# Altium footprint library ST封装.PcbLib: 1336 footprints (part 84 of 109)
Each footprint in its own frame and in the unit in brackets; x right, y up, seen from the top. Pads: shape width x height; smd on the part's side, far side on the other; paste and mask are expansions set on the pad; w line width, h text height; cw(c..) or ccw(c..) is an arc to the next point about the centre after c.
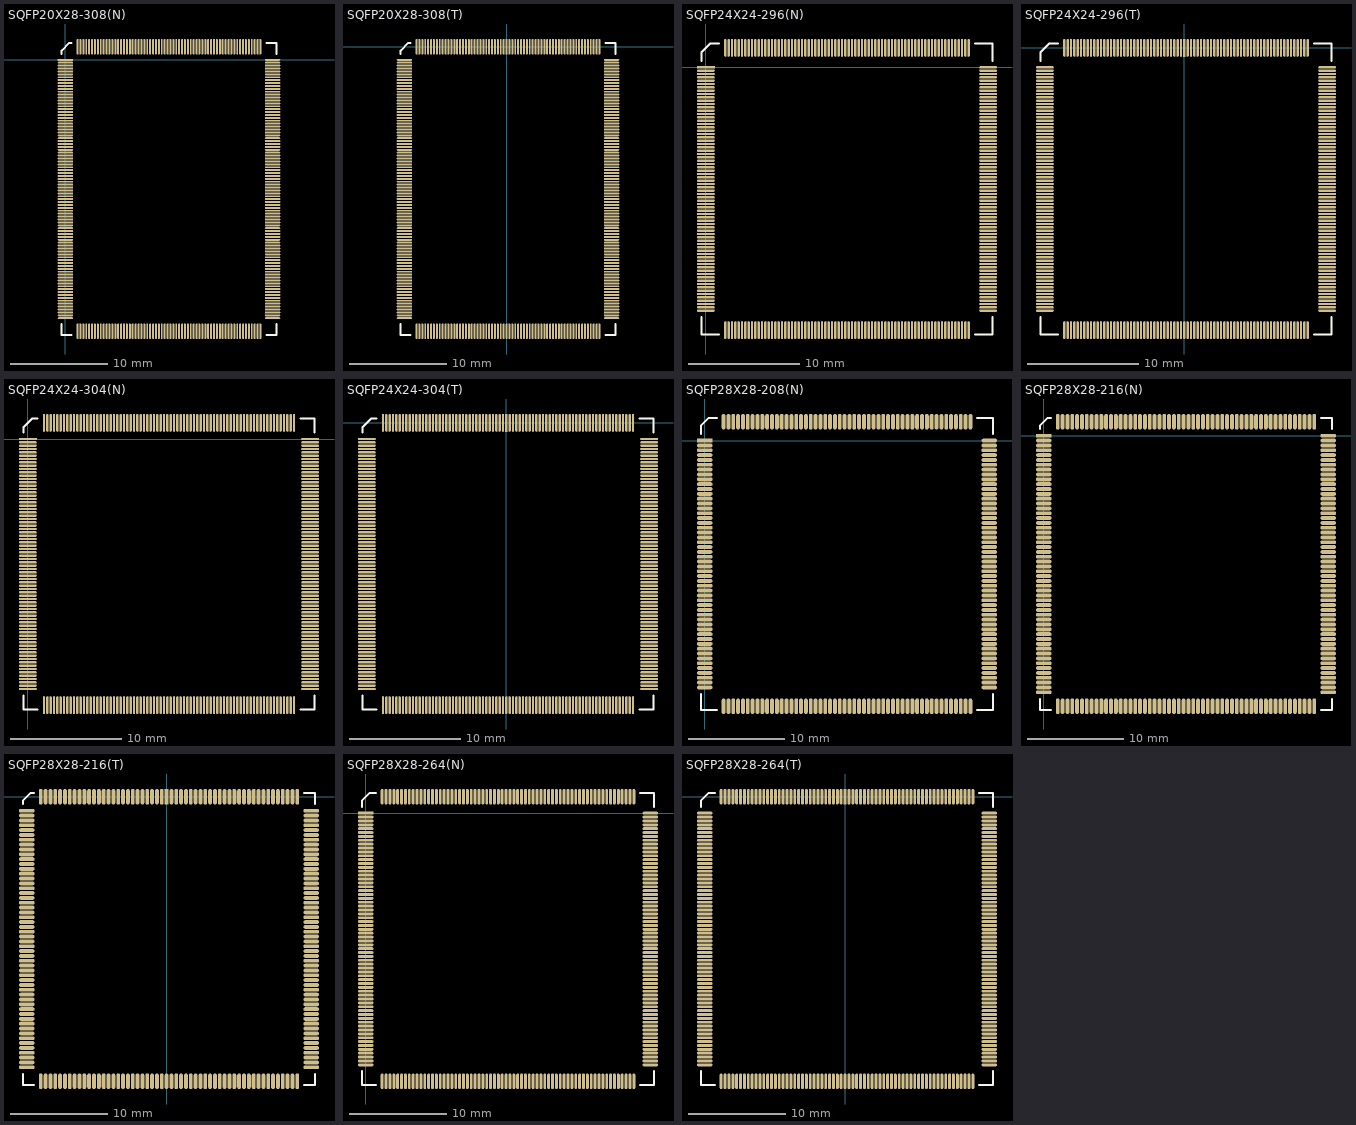
[diagram p83: the footprints below, top view; thin cyan lines are the x and y axes]

## SQFP20X28-308(N) [mm]
pads (308):
  rect 1.6x0.2 smd: 1(0,0)
  oval 1.6x0.2 smd: 2(0,-0.3) 3(0,-0.6) 4(0,-0.9) 5(0,-1.2) 6(0,-1.5) 7(0,-1.8) 8(0,-2.1) 9(0,-2.4) 10(0,-2.7) 11(0,-3) 12(0,-3.3) 13(0,-3.6) 14(0,-3.9) 15(0,-4.2) 16(0,-4.5) 17(0,-4.8) 18(0,-5.1) 19(0,-5.4) 20(0,-5.7) 21(0,-6) 22(0,-6.3) 23(0,-6.6) 24(0,-6.9) 25(0,-7.2) 26(0,-7.5) 27(0,-7.8) 28(0,-8.1) 29(0,-8.4) 30(0,-8.7) 31(0,-9) 32(0,-9.3) 33(0,-9.6) 34(0,-9.9) 35(0,-10.2) 36(0,-10.5) 37(0,-10.8) 38(0,-11.1) 39(0,-11.4) 40(0,-11.7) 41(0,-12) 42(0,-12.3) 43(0,-12.6) 44(0,-12.9) 45(0,-13.2) 46(0,-13.5) 47(0,-13.8) 48(0,-14.1) 49(0,-14.4) 50(0,-14.7) 51(0,-15) 52(0,-15.3) 53(0,-15.6) 54(0,-15.9) 55(0,-16.2) 56(0,-16.5) 57(0,-16.8) 58(0,-17.1) 59(0,-17.4) 60(0,-17.7) 61(0,-18) 62(0,-18.3) 63(0,-18.6) 64(0,-18.9) 65(0,-19.2) 66(0,-19.5) 67(0,-19.8) 68(0,-20.1) 69(0,-20.4) 70(0,-20.7) 71(0,-21) 72(0,-21.3) 73(0,-21.6) 74(0,-21.9) 75(0,-22.2) 76(0,-22.5) 77(0,-22.8) 78(0,-23.1) 79(0,-23.4) 80(0,-23.7) 81(0,-24) 82(0,-24.3) 83(0,-24.6) 84(0,-24.9) 85(0,-25.2) 86(0,-25.5) 87(0,-25.8) 88(0,-26.1) 89(0,-26.4) 90(0,-26.7) 155(21.4,-26.7) 156(21.4,-26.4) 157(21.4,-26.1) 158(21.4,-25.8) 159(21.4,-25.5) 160(21.4,-25.2) 161(21.4,-24.9) 162(21.4,-24.6) 163(21.4,-24.3) 164(21.4,-24) 165(21.4,-23.7) 166(21.4,-23.4) 167(21.4,-23.1) 168(21.4,-22.8) 169(21.4,-22.5) 170(21.4,-22.2) 171(21.4,-21.9) 172(21.4,-21.6) 173(21.4,-21.3) 174(21.4,-21) 175(21.4,-20.7) 176(21.4,-20.4) 177(21.4,-20.1) 178(21.4,-19.8) 179(21.4,-19.5) 180(21.4,-19.2) 181(21.4,-18.9) 182(21.4,-18.6) 183(21.4,-18.3) 184(21.4,-18) 185(21.4,-17.7) 186(21.4,-17.4) 187(21.4,-17.1) 188(21.4,-16.8) 189(21.4,-16.5) 190(21.4,-16.2) 191(21.4,-15.9) 192(21.4,-15.6) 193(21.4,-15.3) 194(21.4,-15) 195(21.4,-14.7) 196(21.4,-14.4) 197(21.4,-14.1) 198(21.4,-13.8) 199(21.4,-13.5) 200(21.4,-13.2) 201(21.4,-12.9) 202(21.4,-12.6) 203(21.4,-12.3) 204(21.4,-12) 205(21.4,-11.7) 206(21.4,-11.4) 207(21.4,-11.1) 208(21.4,-10.8) 209(21.4,-10.5) 210(21.4,-10.2) 211(21.4,-9.9) 212(21.4,-9.6) 213(21.4,-9.3) 214(21.4,-9) 215(21.4,-8.7) 216(21.4,-8.4) 217(21.4,-8.1) 218(21.4,-7.8) 219(21.4,-7.5) 220(21.4,-7.2) 221(21.4,-6.9) 222(21.4,-6.6) 223(21.4,-6.3) 224(21.4,-6) 225(21.4,-5.7) 226(21.4,-5.4) 227(21.4,-5.1) 228(21.4,-4.8) 229(21.4,-4.5) 230(21.4,-4.2) 231(21.4,-3.9) 232(21.4,-3.6) 233(21.4,-3.3) 234(21.4,-3) 235(21.4,-2.7) 236(21.4,-2.4) 237(21.4,-2.1) 238(21.4,-1.8) 239(21.4,-1.5) 240(21.4,-1.2) 241(21.4,-0.9) 242(21.4,-0.6) 243(21.4,-0.3) 244(21.4,0)
  oval 0.2x1.6 smd: 91(1.25,-28.05) 92(1.55,-28.05) 93(1.85,-28.05) 94(2.15,-28.05) 95(2.45,-28.05) 96(2.75,-28.05) 97(3.05,-28.05) 98(3.35,-28.05) 99(3.65,-28.05) 100(3.95,-28.05) 101(4.25,-28.05) 102(4.55,-28.05) 103(4.85,-28.05) 104(5.15,-28.05) 105(5.45,-28.05) 106(5.75,-28.05) 107(6.05,-28.05) 108(6.35,-28.05) 109(6.65,-28.05) 110(6.95,-28.05) 111(7.25,-28.05) 112(7.55,-28.05) 113(7.85,-28.05) 114(8.15,-28.05) 115(8.45,-28.05) 116(8.75,-28.05) 117(9.05,-28.05) 118(9.35,-28.05) 119(9.65,-28.05) 120(9.95,-28.05) 121(10.25,-28.05) 122(10.55,-28.05) 123(10.85,-28.05) 124(11.15,-28.05) 125(11.45,-28.05) 126(11.75,-28.05) 127(12.05,-28.05) 128(12.35,-28.05) 129(12.65,-28.05) 130(12.95,-28.05) 131(13.25,-28.05) 132(13.55,-28.05) 133(13.85,-28.05) 134(14.15,-28.05) 135(14.45,-28.05) 136(14.75,-28.05) 137(15.05,-28.05) 138(15.35,-28.05) 139(15.65,-28.05) 140(15.95,-28.05) 141(16.25,-28.05) 142(16.55,-28.05) 143(16.85,-28.05) 144(17.15,-28.05) 145(17.45,-28.05) 146(17.75,-28.05) 147(18.05,-28.05) 148(18.35,-28.05) 149(18.65,-28.05) 150(18.95,-28.05) 151(19.25,-28.05) 152(19.55,-28.05) 153(19.85,-28.05) 154(20.15,-28.05) 245(20.15,1.35) 246(19.85,1.35) 247(19.55,1.35) 248(19.25,1.35) 249(18.95,1.35) 250(18.65,1.35) 251(18.35,1.35) 252(18.05,1.35) 253(17.75,1.35) 254(17.45,1.35) 255(17.15,1.35) 256(16.85,1.35) 257(16.55,1.35) 258(16.25,1.35) 259(15.95,1.35) 260(15.65,1.35) 261(15.35,1.35) 262(15.05,1.35) 263(14.75,1.35) 264(14.45,1.35) 265(14.15,1.35) 266(13.85,1.35) 267(13.55,1.35) 268(13.25,1.35) 269(12.95,1.35) 270(12.65,1.35) 271(12.35,1.35) 272(12.05,1.35) 273(11.75,1.35) 274(11.45,1.35) 275(11.15,1.35) 276(10.85,1.35) 277(10.55,1.35) 278(10.25,1.35) 279(9.95,1.35) 280(9.65,1.35) 281(9.35,1.35) 282(9.05,1.35) 283(8.75,1.35) 284(8.45,1.35) 285(8.15,1.35) 286(7.85,1.35) 287(7.55,1.35) 288(7.25,1.35) 289(6.95,1.35) 290(6.65,1.35) 291(6.35,1.35) 292(6.05,1.35) 293(5.75,1.35) 294(5.45,1.35) 295(5.15,1.35) 296(4.85,1.35) 297(4.55,1.35) 298(4.25,1.35) 299(3.95,1.35) 300(3.65,1.35) 301(3.35,1.35) 302(3.05,1.35) 303(2.75,1.35) 304(2.45,1.35) 305(2.15,1.35) 306(1.85,1.35) 307(1.55,1.35) 308(1.25,1.35)
Top Overlay:
  lines w0.2: -0.4,-27.3 -0.4,-28.45 0.65,-28.45 ; -0.4,0.6 -0.4,0.95 0.4,1.75 0.65,1.75 ; 20.75,-28.45 21.8,-28.45 21.8,-27.3 ; 20.75,1.75 21.8,1.75 21.8,0.6

## SQFP20X28-308(T) [mm]
pads (308):
  rect 0.2x1.6 smd: 1(0,0)
  oval 0.2x1.6 smd: 2(-0.3,0) 3(-0.6,0) 4(-0.9,0) 5(-1.2,0) 6(-1.5,0) 7(-1.8,0) 8(-2.1,0) 9(-2.4,0) 10(-2.7,0) 11(-3,0) 12(-3.3,0) 13(-3.6,0) 14(-3.9,0) 15(-4.2,0) 16(-4.5,0) 17(-4.8,0) 18(-5.1,0) 19(-5.4,0) 20(-5.7,0) 21(-6,0) 22(-6.3,0) 23(-6.6,0) 24(-6.9,0) 25(-7.2,0) 26(-7.5,0) 27(-7.8,0) 28(-8.1,0) 29(-8.4,0) 30(-8.7,0) 31(-9,0) 32(-9.3,0) 123(-9.3,-29.4) 124(-9,-29.4) 125(-8.7,-29.4) 126(-8.4,-29.4) 127(-8.1,-29.4) 128(-7.8,-29.4) 129(-7.5,-29.4) 130(-7.2,-29.4) 131(-6.9,-29.4) 132(-6.6,-29.4) 133(-6.3,-29.4) 134(-6,-29.4) 135(-5.7,-29.4) 136(-5.4,-29.4) 137(-5.1,-29.4) 138(-4.8,-29.4) 139(-4.5,-29.4) 140(-4.2,-29.4) 141(-3.9,-29.4) 142(-3.6,-29.4) 143(-3.3,-29.4) 144(-3,-29.4) 145(-2.7,-29.4) 146(-2.4,-29.4) 147(-2.1,-29.4) 148(-1.8,-29.4) 149(-1.5,-29.4) 150(-1.2,-29.4) 151(-0.9,-29.4) 152(-0.6,-29.4) 153(-0.3,-29.4) 154(0,-29.4) 155(0.3,-29.4) 156(0.6,-29.4) 157(0.9,-29.4) 158(1.2,-29.4) 159(1.5,-29.4) 160(1.8,-29.4) 161(2.1,-29.4) 162(2.4,-29.4) 163(2.7,-29.4) 164(3,-29.4) 165(3.3,-29.4) 166(3.6,-29.4) 167(3.9,-29.4) 168(4.2,-29.4) 169(4.5,-29.4) 170(4.8,-29.4) 171(5.1,-29.4) 172(5.4,-29.4) 173(5.7,-29.4) 174(6,-29.4) 175(6.3,-29.4) 176(6.6,-29.4) 177(6.9,-29.4) 178(7.2,-29.4) 179(7.5,-29.4) 180(7.8,-29.4) 181(8.1,-29.4) 182(8.4,-29.4) 183(8.7,-29.4) 184(9,-29.4) 185(9.3,-29.4) 186(9.6,-29.4) 277(9.6,0) 278(9.3,0) 279(9,0) 280(8.7,0) 281(8.4,0) 282(8.1,0) 283(7.8,0) 284(7.5,0) 285(7.2,0) 286(6.9,0) 287(6.6,0) 288(6.3,0) 289(6,0) 290(5.7,0) 291(5.4,0) 292(5.1,0) 293(4.8,0) 294(4.5,0) 295(4.2,0) 296(3.9,0) 297(3.6,0) 298(3.3,0) 299(3,0) 300(2.7,0) 301(2.4,0) 302(2.1,0) 303(1.8,0) 304(1.5,0) 305(1.2,0) 306(0.9,0) 307(0.6,0) 308(0.3,0)
  oval 1.6x0.2 smd: 33(-10.55,-1.35) 34(-10.55,-1.65) 35(-10.55,-1.95) 36(-10.55,-2.25) 37(-10.55,-2.55) 38(-10.55,-2.85) 39(-10.55,-3.15) 40(-10.55,-3.45) 41(-10.55,-3.75) 42(-10.55,-4.05) 43(-10.55,-4.35) 44(-10.55,-4.65) 45(-10.55,-4.95) 46(-10.55,-5.25) 47(-10.55,-5.55) 48(-10.55,-5.85) 49(-10.55,-6.15) 50(-10.55,-6.45) 51(-10.55,-6.75) 52(-10.55,-7.05) 53(-10.55,-7.35) 54(-10.55,-7.65) 55(-10.55,-7.95) 56(-10.55,-8.25) 57(-10.55,-8.55) 58(-10.55,-8.85) 59(-10.55,-9.15) 60(-10.55,-9.45) 61(-10.55,-9.75) 62(-10.55,-10.05) 63(-10.55,-10.35) 64(-10.55,-10.65) 65(-10.55,-10.95) 66(-10.55,-11.25) 67(-10.55,-11.55) 68(-10.55,-11.85) 69(-10.55,-12.15) 70(-10.55,-12.45) 71(-10.55,-12.75) 72(-10.55,-13.05) 73(-10.55,-13.35) 74(-10.55,-13.65) 75(-10.55,-13.95) 76(-10.55,-14.25) 77(-10.55,-14.55) 78(-10.55,-14.85) 79(-10.55,-15.15) 80(-10.55,-15.45) 81(-10.55,-15.75) 82(-10.55,-16.05) 83(-10.55,-16.35) 84(-10.55,-16.65) 85(-10.55,-16.95) 86(-10.55,-17.25) 87(-10.55,-17.55) 88(-10.55,-17.85) 89(-10.55,-18.15) 90(-10.55,-18.45) 91(-10.55,-18.75) 92(-10.55,-19.05) 93(-10.55,-19.35) 94(-10.55,-19.65) 95(-10.55,-19.95) 96(-10.55,-20.25) 97(-10.55,-20.55) 98(-10.55,-20.85) 99(-10.55,-21.15) 100(-10.55,-21.45) 101(-10.55,-21.75) 102(-10.55,-22.05) 103(-10.55,-22.35) 104(-10.55,-22.65) 105(-10.55,-22.95) 106(-10.55,-23.25) 107(-10.55,-23.55) 108(-10.55,-23.85) 109(-10.55,-24.15) 110(-10.55,-24.45) 111(-10.55,-24.75) 112(-10.55,-25.05) 113(-10.55,-25.35) 114(-10.55,-25.65) 115(-10.55,-25.95) 116(-10.55,-26.25) 117(-10.55,-26.55) 118(-10.55,-26.85) 119(-10.55,-27.15) 120(-10.55,-27.45) 121(-10.55,-27.75) 122(-10.55,-28.05) 187(10.85,-28.05) 188(10.85,-27.75) 189(10.85,-27.45) 190(10.85,-27.15) 191(10.85,-26.85) 192(10.85,-26.55) 193(10.85,-26.25) 194(10.85,-25.95) 195(10.85,-25.65) 196(10.85,-25.35) 197(10.85,-25.05) 198(10.85,-24.75) 199(10.85,-24.45) 200(10.85,-24.15) 201(10.85,-23.85) 202(10.85,-23.55) 203(10.85,-23.25) 204(10.85,-22.95) 205(10.85,-22.65) 206(10.85,-22.35) 207(10.85,-22.05) 208(10.85,-21.75) 209(10.85,-21.45) 210(10.85,-21.15) 211(10.85,-20.85) 212(10.85,-20.55) 213(10.85,-20.25) 214(10.85,-19.95) 215(10.85,-19.65) 216(10.85,-19.35) 217(10.85,-19.05) 218(10.85,-18.75) 219(10.85,-18.45) 220(10.85,-18.15) 221(10.85,-17.85) 222(10.85,-17.55) 223(10.85,-17.25) 224(10.85,-16.95) 225(10.85,-16.65) 226(10.85,-16.35) 227(10.85,-16.05) 228(10.85,-15.75) 229(10.85,-15.45) 230(10.85,-15.15) 231(10.85,-14.85) 232(10.85,-14.55) 233(10.85,-14.25) 234(10.85,-13.95) 235(10.85,-13.65) 236(10.85,-13.35) 237(10.85,-13.05) 238(10.85,-12.75) 239(10.85,-12.45) 240(10.85,-12.15) 241(10.85,-11.85) 242(10.85,-11.55) 243(10.85,-11.25) 244(10.85,-10.95) 245(10.85,-10.65) 246(10.85,-10.35) 247(10.85,-10.05) 248(10.85,-9.75) 249(10.85,-9.45) 250(10.85,-9.15) 251(10.85,-8.85) 252(10.85,-8.55) 253(10.85,-8.25) 254(10.85,-7.95) 255(10.85,-7.65) 256(10.85,-7.35) 257(10.85,-7.05) 258(10.85,-6.75) 259(10.85,-6.45) 260(10.85,-6.15) 261(10.85,-5.85) 262(10.85,-5.55) 263(10.85,-5.25) 264(10.85,-4.95) 265(10.85,-4.65) 266(10.85,-4.35) 267(10.85,-4.05) 268(10.85,-3.75) 269(10.85,-3.45) 270(10.85,-3.15) 271(10.85,-2.85) 272(10.85,-2.55) 273(10.85,-2.25) 274(10.85,-1.95) 275(10.85,-1.65) 276(10.85,-1.35)
Top Overlay:
  lines w0.2: -10.95,-28.65 -10.95,-29.8 -9.9,-29.8 ; -10.95,-0.75 -10.95,-0.4 -10.15,0.4 -9.9,0.4 ; 10.2,-29.8 11.25,-29.8 11.25,-28.65 ; 10.2,0.4 11.25,0.4 11.25,-0.75

## SQFP24X24-296(N) [mm]
pads (296):
  rect 1.6x0.2 smd: 1(0,0)
  oval 1.6x0.2 smd: 2(0,-0.3) 3(0,-0.6) 4(0,-0.9) 5(0,-1.2) 6(0,-1.5) 7(0,-1.8) 8(0,-2.1) 9(0,-2.4) 10(0,-2.7) 11(0,-3) 12(0,-3.3) 13(0,-3.6) 14(0,-3.9) 15(0,-4.2) 16(0,-4.5) 17(0,-4.8) 18(0,-5.1) 19(0,-5.4) 20(0,-5.7) 21(0,-6) 22(0,-6.3) 23(0,-6.6) 24(0,-6.9) 25(0,-7.2) 26(0,-7.5) 27(0,-7.8) 28(0,-8.1) 29(0,-8.4) 30(0,-8.7) 31(0,-9) 32(0,-9.3) 33(0,-9.6) 34(0,-9.9) 35(0,-10.2) 36(0,-10.5) 37(0,-10.8) 38(0,-11.1) 39(0,-11.4) 40(0,-11.7) 41(0,-12) 42(0,-12.3) 43(0,-12.6) 44(0,-12.9) 45(0,-13.2) 46(0,-13.5) 47(0,-13.8) 48(0,-14.1) 49(0,-14.4) 50(0,-14.7) 51(0,-15) 52(0,-15.3) 53(0,-15.6) 54(0,-15.9) 55(0,-16.2) 56(0,-16.5) 57(0,-16.8) 58(0,-17.1) 59(0,-17.4) 60(0,-17.7) 61(0,-18) 62(0,-18.3) 63(0,-18.6) 64(0,-18.9) 65(0,-19.2) 66(0,-19.5) 67(0,-19.8) 68(0,-20.1) 69(0,-20.4) 70(0,-20.7) 71(0,-21) 72(0,-21.3) 73(0,-21.6) 74(0,-21.9) 149(25.4,-21.9) 150(25.4,-21.6) 151(25.4,-21.3) 152(25.4,-21) 153(25.4,-20.7) 154(25.4,-20.4) 155(25.4,-20.1) 156(25.4,-19.8) 157(25.4,-19.5) 158(25.4,-19.2) 159(25.4,-18.9) 160(25.4,-18.6) 161(25.4,-18.3) 162(25.4,-18) 163(25.4,-17.7) 164(25.4,-17.4) 165(25.4,-17.1) 166(25.4,-16.8) 167(25.4,-16.5) 168(25.4,-16.2) 169(25.4,-15.9) 170(25.4,-15.6) 171(25.4,-15.3) 172(25.4,-15) 173(25.4,-14.7) 174(25.4,-14.4) 175(25.4,-14.1) 176(25.4,-13.8) 177(25.4,-13.5) 178(25.4,-13.2) 179(25.4,-12.9) 180(25.4,-12.6) 181(25.4,-12.3) 182(25.4,-12) 183(25.4,-11.7) 184(25.4,-11.4) 185(25.4,-11.1) 186(25.4,-10.8) 187(25.4,-10.5) 188(25.4,-10.2) 189(25.4,-9.9) 190(25.4,-9.6) 191(25.4,-9.3) 192(25.4,-9) 193(25.4,-8.7) 194(25.4,-8.4) 195(25.4,-8.1) 196(25.4,-7.8) 197(25.4,-7.5) 198(25.4,-7.2) 199(25.4,-6.9) 200(25.4,-6.6) 201(25.4,-6.3) 202(25.4,-6) 203(25.4,-5.7) 204(25.4,-5.4) 205(25.4,-5.1) 206(25.4,-4.8) 207(25.4,-4.5) 208(25.4,-4.2) 209(25.4,-3.9) 210(25.4,-3.6) 211(25.4,-3.3) 212(25.4,-3) 213(25.4,-2.7) 214(25.4,-2.4) 215(25.4,-2.1) 216(25.4,-1.8) 217(25.4,-1.5) 218(25.4,-1.2) 219(25.4,-0.9) 220(25.4,-0.6) 221(25.4,-0.3) 222(25.4,0)
  oval 0.2x1.6 smd: 75(1.75,-23.65) 76(2.05,-23.65) 77(2.35,-23.65) 78(2.65,-23.65) 79(2.95,-23.65) 80(3.25,-23.65) 81(3.55,-23.65) 82(3.85,-23.65) 83(4.15,-23.65) 84(4.45,-23.65) 85(4.75,-23.65) 86(5.05,-23.65) 87(5.35,-23.65) 88(5.65,-23.65) 89(5.95,-23.65) 90(6.25,-23.65) 91(6.55,-23.65) 92(6.85,-23.65) 93(7.15,-23.65) 94(7.45,-23.65) 95(7.75,-23.65) 96(8.05,-23.65) 97(8.35,-23.65) 98(8.65,-23.65) 99(8.95,-23.65) 100(9.25,-23.65) 101(9.55,-23.65) 102(9.85,-23.65) 103(10.15,-23.65) 104(10.45,-23.65) 105(10.75,-23.65) 106(11.05,-23.65) 107(11.35,-23.65) 108(11.65,-23.65) 109(11.95,-23.65) 110(12.25,-23.65) 111(12.55,-23.65) 112(12.85,-23.65) 113(13.15,-23.65) 114(13.45,-23.65) 115(13.75,-23.65) 116(14.05,-23.65) 117(14.35,-23.65) 118(14.65,-23.65) 119(14.95,-23.65) 120(15.25,-23.65) 121(15.55,-23.65) 122(15.85,-23.65) 123(16.15,-23.65) 124(16.45,-23.65) 125(16.75,-23.65) 126(17.05,-23.65) 127(17.35,-23.65) 128(17.65,-23.65) 129(17.95,-23.65) 130(18.25,-23.65) 131(18.55,-23.65) 132(18.85,-23.65) 133(19.15,-23.65) 134(19.45,-23.65) 135(19.75,-23.65) 136(20.05,-23.65) 137(20.35,-23.65) 138(20.65,-23.65) 139(20.95,-23.65) 140(21.25,-23.65) 141(21.55,-23.65) 142(21.85,-23.65) 143(22.15,-23.65) 144(22.45,-23.65) 145(22.75,-23.65) 146(23.05,-23.65) 147(23.35,-23.65) 148(23.65,-23.65) 223(23.65,1.75) 224(23.35,1.75) 225(23.05,1.75) 226(22.75,1.75) 227(22.45,1.75) 228(22.15,1.75) 229(21.85,1.75) 230(21.55,1.75) 231(21.25,1.75) 232(20.95,1.75) 233(20.65,1.75) 234(20.35,1.75) 235(20.05,1.75) 236(19.75,1.75) 237(19.45,1.75) 238(19.15,1.75) 239(18.85,1.75) 240(18.55,1.75) 241(18.25,1.75) 242(17.95,1.75) 243(17.65,1.75) 244(17.35,1.75) 245(17.05,1.75) 246(16.75,1.75) 247(16.45,1.75) 248(16.15,1.75) 249(15.85,1.75) 250(15.55,1.75) 251(15.25,1.75) 252(14.95,1.75) 253(14.65,1.75) 254(14.35,1.75) 255(14.05,1.75) 256(13.75,1.75) 257(13.45,1.75) 258(13.15,1.75) 259(12.85,1.75) 260(12.55,1.75) 261(12.25,1.75) 262(11.95,1.75) 263(11.65,1.75) 264(11.35,1.75) 265(11.05,1.75) 266(10.75,1.75) 267(10.45,1.75) 268(10.15,1.75) 269(9.85,1.75) 270(9.55,1.75) 271(9.25,1.75) 272(8.95,1.75) 273(8.65,1.75) 274(8.35,1.75) 275(8.05,1.75) 276(7.75,1.75) 277(7.45,1.75) 278(7.15,1.75) 279(6.85,1.75) 280(6.55,1.75) 281(6.25,1.75) 282(5.95,1.75) 283(5.65,1.75) 284(5.35,1.75) 285(5.05,1.75) 286(4.75,1.75) 287(4.45,1.75) 288(4.15,1.75) 289(3.85,1.75) 290(3.55,1.75) 291(3.25,1.75) 292(2.95,1.75) 293(2.65,1.75) 294(2.35,1.75) 295(2.05,1.75) 296(1.75,1.75)
Top Overlay:
  lines w0.2: -0.4,-22.5 -0.4,-24.05 1.15,-24.05 ; -0.4,0.6 -0.4,1.35 0.4,2.15 1.15,2.15 ; 24.25,-24.05 25.8,-24.05 25.8,-22.5 ; 24.25,2.15 25.8,2.15 25.8,0.6

## SQFP24X24-296(T) [mm]
pads (296):
  rect 0.2x1.6 smd: 1(0,0)
  oval 0.2x1.6 smd: 2(-0.3,0) 3(-0.6,0) 4(-0.9,0) 5(-1.2,0) 6(-1.5,0) 7(-1.8,0) 8(-2.1,0) 9(-2.4,0) 10(-2.7,0) 11(-3,0) 12(-3.3,0) 13(-3.6,0) 14(-3.9,0) 15(-4.2,0) 16(-4.5,0) 17(-4.8,0) 18(-5.1,0) 19(-5.4,0) 20(-5.7,0) 21(-6,0) 22(-6.3,0) 23(-6.6,0) 24(-6.9,0) 25(-7.2,0) 26(-7.5,0) 27(-7.8,0) 28(-8.1,0) 29(-8.4,0) 30(-8.7,0) 31(-9,0) 32(-9.3,0) 33(-9.6,0) 34(-9.9,0) 35(-10.2,0) 36(-10.5,0) 37(-10.8,0) 112(-10.8,-25.4) 113(-10.5,-25.4) 114(-10.2,-25.4) 115(-9.9,-25.4) 116(-9.6,-25.4) 117(-9.3,-25.4) 118(-9,-25.4) 119(-8.7,-25.4) 120(-8.4,-25.4) 121(-8.1,-25.4) 122(-7.8,-25.4) 123(-7.5,-25.4) 124(-7.2,-25.4) 125(-6.9,-25.4) 126(-6.6,-25.4) 127(-6.3,-25.4) 128(-6,-25.4) 129(-5.7,-25.4) 130(-5.4,-25.4) 131(-5.1,-25.4) 132(-4.8,-25.4) 133(-4.5,-25.4) 134(-4.2,-25.4) 135(-3.9,-25.4) 136(-3.6,-25.4) 137(-3.3,-25.4) 138(-3,-25.4) 139(-2.7,-25.4) 140(-2.4,-25.4) 141(-2.1,-25.4) 142(-1.8,-25.4) 143(-1.5,-25.4) 144(-1.2,-25.4) 145(-0.9,-25.4) 146(-0.6,-25.4) 147(-0.3,-25.4) 148(0,-25.4) 149(0.3,-25.4) 150(0.6,-25.4) 151(0.9,-25.4) 152(1.2,-25.4) 153(1.5,-25.4) 154(1.8,-25.4) 155(2.1,-25.4) 156(2.4,-25.4) 157(2.7,-25.4) 158(3,-25.4) 159(3.3,-25.4) 160(3.6,-25.4) 161(3.9,-25.4) 162(4.2,-25.4) 163(4.5,-25.4) 164(4.8,-25.4) 165(5.1,-25.4) 166(5.4,-25.4) 167(5.7,-25.4) 168(6,-25.4) 169(6.3,-25.4) 170(6.6,-25.4) 171(6.9,-25.4) 172(7.2,-25.4) 173(7.5,-25.4) 174(7.8,-25.4) 175(8.1,-25.4) 176(8.4,-25.4) 177(8.7,-25.4) 178(9,-25.4) 179(9.3,-25.4) 180(9.6,-25.4) 181(9.9,-25.4) 182(10.2,-25.4) 183(10.5,-25.4) 184(10.8,-25.4) 185(11.1,-25.4) 260(11.1,0) 261(10.8,0) 262(10.5,0) 263(10.2,0) 264(9.9,0) 265(9.6,0) 266(9.3,0) 267(9,0) 268(8.7,0) 269(8.4,0) 270(8.1,0) 271(7.8,0) 272(7.5,0) 273(7.2,0) 274(6.9,0) 275(6.6,0) 276(6.3,0) 277(6,0) 278(5.7,0) 279(5.4,0) 280(5.1,0) 281(4.8,0) 282(4.5,0) 283(4.2,0) 284(3.9,0) 285(3.6,0) 286(3.3,0) 287(3,0) 288(2.7,0) 289(2.4,0) 290(2.1,0) 291(1.8,0) 292(1.5,0) 293(1.2,0) 294(0.9,0) 295(0.6,0) 296(0.3,0)
  oval 1.6x0.2 smd: 38(-12.55,-1.75) 39(-12.55,-2.05) 40(-12.55,-2.35) 41(-12.55,-2.65) 42(-12.55,-2.95) 43(-12.55,-3.25) 44(-12.55,-3.55) 45(-12.55,-3.85) 46(-12.55,-4.15) 47(-12.55,-4.45) 48(-12.55,-4.75) 49(-12.55,-5.05) 50(-12.55,-5.35) 51(-12.55,-5.65) 52(-12.55,-5.95) 53(-12.55,-6.25) 54(-12.55,-6.55) 55(-12.55,-6.85) 56(-12.55,-7.15) 57(-12.55,-7.45) 58(-12.55,-7.75) 59(-12.55,-8.05) 60(-12.55,-8.35) 61(-12.55,-8.65) 62(-12.55,-8.95) 63(-12.55,-9.25) 64(-12.55,-9.55) 65(-12.55,-9.85) 66(-12.55,-10.15) 67(-12.55,-10.45) 68(-12.55,-10.75) 69(-12.55,-11.05) 70(-12.55,-11.35) 71(-12.55,-11.65) 72(-12.55,-11.95) 73(-12.55,-12.25) 74(-12.55,-12.55) 75(-12.55,-12.85) 76(-12.55,-13.15) 77(-12.55,-13.45) 78(-12.55,-13.75) 79(-12.55,-14.05) 80(-12.55,-14.35) 81(-12.55,-14.65) 82(-12.55,-14.95) 83(-12.55,-15.25) 84(-12.55,-15.55) 85(-12.55,-15.85) 86(-12.55,-16.15) 87(-12.55,-16.45) 88(-12.55,-16.75) 89(-12.55,-17.05) 90(-12.55,-17.35) 91(-12.55,-17.65) 92(-12.55,-17.95) 93(-12.55,-18.25) 94(-12.55,-18.55) 95(-12.55,-18.85) 96(-12.55,-19.15) 97(-12.55,-19.45) 98(-12.55,-19.75) 99(-12.55,-20.05) 100(-12.55,-20.35) 101(-12.55,-20.65) 102(-12.55,-20.95) 103(-12.55,-21.25) 104(-12.55,-21.55) 105(-12.55,-21.85) 106(-12.55,-22.15) 107(-12.55,-22.45) 108(-12.55,-22.75) 109(-12.55,-23.05) 110(-12.55,-23.35) 111(-12.55,-23.65) 186(12.85,-23.65) 187(12.85,-23.35) 188(12.85,-23.05) 189(12.85,-22.75) 190(12.85,-22.45) 191(12.85,-22.15) 192(12.85,-21.85) 193(12.85,-21.55) 194(12.85,-21.25) 195(12.85,-20.95) 196(12.85,-20.65) 197(12.85,-20.35) 198(12.85,-20.05) 199(12.85,-19.75) 200(12.85,-19.45) 201(12.85,-19.15) 202(12.85,-18.85) 203(12.85,-18.55) 204(12.85,-18.25) 205(12.85,-17.95) 206(12.85,-17.65) 207(12.85,-17.35) 208(12.85,-17.05) 209(12.85,-16.75) 210(12.85,-16.45) 211(12.85,-16.15) 212(12.85,-15.85) 213(12.85,-15.55) 214(12.85,-15.25) 215(12.85,-14.95) 216(12.85,-14.65) 217(12.85,-14.35) 218(12.85,-14.05) 219(12.85,-13.75) 220(12.85,-13.45) 221(12.85,-13.15) 222(12.85,-12.85) 223(12.85,-12.55) 224(12.85,-12.25) 225(12.85,-11.95) 226(12.85,-11.65) 227(12.85,-11.35) 228(12.85,-11.05) 229(12.85,-10.75) 230(12.85,-10.45) 231(12.85,-10.15) 232(12.85,-9.85) 233(12.85,-9.55) 234(12.85,-9.25) 235(12.85,-8.95) 236(12.85,-8.65) 237(12.85,-8.35) 238(12.85,-8.05) 239(12.85,-7.75) 240(12.85,-7.45) 241(12.85,-7.15) 242(12.85,-6.85) 243(12.85,-6.55) 244(12.85,-6.25) 245(12.85,-5.95) 246(12.85,-5.65) 247(12.85,-5.35) 248(12.85,-5.05) 249(12.85,-4.75) 250(12.85,-4.45) 251(12.85,-4.15) 252(12.85,-3.85) 253(12.85,-3.55) 254(12.85,-3.25) 255(12.85,-2.95) 256(12.85,-2.65) 257(12.85,-2.35) 258(12.85,-2.05) 259(12.85,-1.75)
Top Overlay:
  lines w0.2: -12.95,-24.25 -12.95,-25.8 -11.4,-25.8 ; -12.95,-1.15 -12.95,-0.4 -12.15,0.4 -11.4,0.4 ; 11.7,-25.8 13.25,-25.8 13.25,-24.25 ; 11.7,0.4 13.25,0.4 13.25,-1.15

## SQFP24X24-304(N) [mm]
pads (304):
  rect 1.6x0.2 smd: 1(0,0)
  oval 1.6x0.2 smd: 2(0,-0.3) 3(0,-0.6) 4(0,-0.9) 5(0,-1.2) 6(0,-1.5) 7(0,-1.8) 8(0,-2.1) 9(0,-2.4) 10(0,-2.7) 11(0,-3) 12(0,-3.3) 13(0,-3.6) 14(0,-3.9) 15(0,-4.2) 16(0,-4.5) 17(0,-4.8) 18(0,-5.1) 19(0,-5.4) 20(0,-5.7) 21(0,-6) 22(0,-6.3) 23(0,-6.6) 24(0,-6.9) 25(0,-7.2) 26(0,-7.5) 27(0,-7.8) 28(0,-8.1) 29(0,-8.4) 30(0,-8.7) 31(0,-9) 32(0,-9.3) 33(0,-9.6) 34(0,-9.9) 35(0,-10.2) 36(0,-10.5) 37(0,-10.8) 38(0,-11.1) 39(0,-11.4) 40(0,-11.7) 41(0,-12) 42(0,-12.3) 43(0,-12.6) 44(0,-12.9) 45(0,-13.2) 46(0,-13.5) 47(0,-13.8) 48(0,-14.1) 49(0,-14.4) 50(0,-14.7) 51(0,-15) 52(0,-15.3) 53(0,-15.6) 54(0,-15.9) 55(0,-16.2) 56(0,-16.5) 57(0,-16.8) 58(0,-17.1) 59(0,-17.4) 60(0,-17.7) 61(0,-18) 62(0,-18.3) 63(0,-18.6) 64(0,-18.9) 65(0,-19.2) 66(0,-19.5) 67(0,-19.8) 68(0,-20.1) 69(0,-20.4) 70(0,-20.7) 71(0,-21) 72(0,-21.3) 73(0,-21.6) 74(0,-21.9) 75(0,-22.2) 76(0,-22.5) 153(25.4,-22.5) 154(25.4,-22.2) 155(25.4,-21.9) 156(25.4,-21.6) 157(25.4,-21.3) 158(25.4,-21) 159(25.4,-20.7) 160(25.4,-20.4) 161(25.4,-20.1) 162(25.4,-19.8) 163(25.4,-19.5) 164(25.4,-19.2) 165(25.4,-18.9) 166(25.4,-18.6) 167(25.4,-18.3) 168(25.4,-18) 169(25.4,-17.7) 170(25.4,-17.4) 171(25.4,-17.1) 172(25.4,-16.8) 173(25.4,-16.5) 174(25.4,-16.2) 175(25.4,-15.9) 176(25.4,-15.6) 177(25.4,-15.3) 178(25.4,-15) 179(25.4,-14.7) 180(25.4,-14.4) 181(25.4,-14.1) 182(25.4,-13.8) 183(25.4,-13.5) 184(25.4,-13.2) 185(25.4,-12.9) 186(25.4,-12.6) 187(25.4,-12.3) 188(25.4,-12) 189(25.4,-11.7) 190(25.4,-11.4) 191(25.4,-11.1) 192(25.4,-10.8) 193(25.4,-10.5) 194(25.4,-10.2) 195(25.4,-9.9) 196(25.4,-9.6) 197(25.4,-9.3) 198(25.4,-9) 199(25.4,-8.7) 200(25.4,-8.4) 201(25.4,-8.1) 202(25.4,-7.8) 203(25.4,-7.5) 204(25.4,-7.2) 205(25.4,-6.9) 206(25.4,-6.6) 207(25.4,-6.3) 208(25.4,-6) 209(25.4,-5.7) 210(25.4,-5.4) 211(25.4,-5.1) 212(25.4,-4.8) 213(25.4,-4.5) 214(25.4,-4.2) 215(25.4,-3.9) 216(25.4,-3.6) 217(25.4,-3.3) 218(25.4,-3) 219(25.4,-2.7) 220(25.4,-2.4) 221(25.4,-2.1) 222(25.4,-1.8) 223(25.4,-1.5) 224(25.4,-1.2) 225(25.4,-0.9) 226(25.4,-0.6) 227(25.4,-0.3) 228(25.4,0)
  oval 0.2x1.6 smd: 77(1.45,-23.95) 78(1.75,-23.95) 79(2.05,-23.95) 80(2.35,-23.95) 81(2.65,-23.95) 82(2.95,-23.95) 83(3.25,-23.95) 84(3.55,-23.95) 85(3.85,-23.95) 86(4.15,-23.95) 87(4.45,-23.95) 88(4.75,-23.95) 89(5.05,-23.95) 90(5.35,-23.95) 91(5.65,-23.95) 92(5.95,-23.95) 93(6.25,-23.95) 94(6.55,-23.95) 95(6.85,-23.95) 96(7.15,-23.95) 97(7.45,-23.95) 98(7.75,-23.95) 99(8.05,-23.95) 100(8.35,-23.95) 101(8.65,-23.95) 102(8.95,-23.95) 103(9.25,-23.95) 104(9.55,-23.95) 105(9.85,-23.95) 106(10.15,-23.95) 107(10.45,-23.95) 108(10.75,-23.95) 109(11.05,-23.95) 110(11.35,-23.95) 111(11.65,-23.95) 112(11.95,-23.95) 113(12.25,-23.95) 114(12.55,-23.95) 115(12.85,-23.95) 116(13.15,-23.95) 117(13.45,-23.95) 118(13.75,-23.95) 119(14.05,-23.95) 120(14.35,-23.95) 121(14.65,-23.95) 122(14.95,-23.95) 123(15.25,-23.95) 124(15.55,-23.95) 125(15.85,-23.95) 126(16.15,-23.95) 127(16.45,-23.95) 128(16.75,-23.95) 129(17.05,-23.95) 130(17.35,-23.95) 131(17.65,-23.95) 132(17.95,-23.95) 133(18.25,-23.95) 134(18.55,-23.95) 135(18.85,-23.95) 136(19.15,-23.95) 137(19.45,-23.95) 138(19.75,-23.95) 139(20.05,-23.95) 140(20.35,-23.95) 141(20.65,-23.95) 142(20.95,-23.95) 143(21.25,-23.95) 144(21.55,-23.95) 145(21.85,-23.95) 146(22.15,-23.95) 147(22.45,-23.95) 148(22.75,-23.95) 149(23.05,-23.95) 150(23.35,-23.95) 151(23.65,-23.95) 152(23.95,-23.95) 229(23.95,1.45) 230(23.65,1.45) 231(23.35,1.45) 232(23.05,1.45) 233(22.75,1.45) 234(22.45,1.45) 235(22.15,1.45) 236(21.85,1.45) 237(21.55,1.45) 238(21.25,1.45) 239(20.95,1.45) 240(20.65,1.45) 241(20.35,1.45) 242(20.05,1.45) 243(19.75,1.45) 244(19.45,1.45) 245(19.15,1.45) 246(18.85,1.45) 247(18.55,1.45) 248(18.25,1.45) 249(17.95,1.45) 250(17.65,1.45) 251(17.35,1.45) 252(17.05,1.45) 253(16.75,1.45) 254(16.45,1.45) 255(16.15,1.45) 256(15.85,1.45) 257(15.55,1.45) 258(15.25,1.45) 259(14.95,1.45) 260(14.65,1.45) 261(14.35,1.45) 262(14.05,1.45) 263(13.75,1.45) 264(13.45,1.45) 265(13.15,1.45) 266(12.85,1.45) 267(12.55,1.45) 268(12.25,1.45) 269(11.95,1.45) 270(11.65,1.45) 271(11.35,1.45) 272(11.05,1.45) 273(10.75,1.45) 274(10.45,1.45) 275(10.15,1.45) 276(9.85,1.45) 277(9.55,1.45) 278(9.25,1.45) 279(8.95,1.45) 280(8.65,1.45) 281(8.35,1.45) 282(8.05,1.45) 283(7.75,1.45) 284(7.45,1.45) 285(7.15,1.45) 286(6.85,1.45) 287(6.55,1.45) 288(6.25,1.45) 289(5.95,1.45) 290(5.65,1.45) 291(5.35,1.45) 292(5.05,1.45) 293(4.75,1.45) 294(4.45,1.45) 295(4.15,1.45) 296(3.85,1.45) 297(3.55,1.45) 298(3.25,1.45) 299(2.95,1.45) 300(2.65,1.45) 301(2.35,1.45) 302(2.05,1.45) 303(1.75,1.45) 304(1.45,1.45)